# Altium footprint library con-samtec.PCBLIB: 805 footprints (part 42 of 55) (continued)
## TSW-133-02-S-D [mm]
pads (66):
  oct 1.5x1.5 hole 1: 1(40.64,-1.27) 2(40.64,1.27) 3(38.1,-1.27) 4(38.1,1.27) 5(35.56,-1.27) 6(35.56,1.27) 7(33.02,-1.27) 8(33.02,1.27) 9(30.48,-1.27) 10(30.48,1.27) 11(27.94,-1.27) 12(27.94,1.27) 13(25.4,-1.27) 14(25.4,1.27) 15(22.86,-1.27) 16(22.86,1.27) 17(20.32,-1.27) 18(20.32,1.27) 19(17.78,-1.27) 20(17.78,1.27) 21(15.24,-1.27) 22(15.24,1.27) 23(12.7,-1.27) 24(12.7,1.27) 25(10.16,-1.27) 26(10.16,1.27) 27(7.62,-1.27) 28(7.62,1.27) 29(5.08,-1.27) 30(5.08,1.27) 31(2.54,-1.27) 32(2.54,1.27) 33(0,-1.27) 34(0,1.27) 35(-2.54,-1.27) 36(-2.54,1.27) 37(-5.08,-1.27) 38(-5.08,1.27) 39(-7.62,-1.27) 40(-7.62,1.27) 41(-10.16,-1.27) 42(-10.16,1.27) 43(-12.7,-1.27) 44(-12.7,1.27) 45(-15.24,-1.27) 46(-15.24,1.27) 47(-17.78,-1.27) 48(-17.78,1.27) 49(-20.32,-1.27) 50(-20.32,1.27) 51(-22.86,-1.27) 52(-22.86,1.27) 53(-25.4,-1.27) 54(-25.4,1.27) 55(-27.94,-1.27) 56(-27.94,1.27) 57(-30.48,-1.27) 58(-30.48,1.27) 59(-33.02,-1.27) 60(-33.02,1.27) 61(-35.56,-1.27) 62(-35.56,1.27) 63(-38.1,-1.27) 64(-38.1,1.27) 65(-40.64,-1.27) 66(-40.64,1.27)
Top Overlay:
  lines w0.203: -42.039,-2.425 42.039,-2.425 42.039,2.425 -42.039,2.425 -42.039,-2.425
  text "1" at 40.432,-3.818 h0.94
  text "2" at 40.257,2.744 h0.94
Mechanical 16:
  rectangle: -40.99,-1.62 -40.29,-0.92
  rectangle: -40.99,0.92 -40.29,1.62
  rectangle: -38.45,-1.62 -37.75,-0.92
  rectangle: -38.45,0.92 -37.75,1.62
  rectangle: -35.91,-1.62 -35.21,-0.92
  rectangle: -35.91,0.92 -35.21,1.62
  rectangle: -33.37,-1.62 -32.67,-0.92
  rectangle: -33.37,0.92 -32.67,1.62
  rectangle: -30.83,-1.62 -30.13,-0.92
  rectangle: -30.83,0.92 -30.13,1.62
  rectangle: -28.29,-1.62 -27.59,-0.92
  rectangle: -28.29,0.92 -27.59,1.62
  rectangle: -25.75,-1.62 -25.05,-0.92
  rectangle: -25.75,0.92 -25.05,1.62
  rectangle: -23.21,-1.62 -22.51,-0.92
  rectangle: -23.21,0.92 -22.51,1.62
  rectangle: -20.67,-1.62 -19.97,-0.92
  rectangle: -20.67,0.92 -19.97,1.62
  rectangle: -18.13,-1.62 -17.43,-0.92
  rectangle: -18.13,0.92 -17.43,1.62
  rectangle: -15.59,-1.62 -14.89,-0.92
  rectangle: -15.59,0.92 -14.89,1.62
  rectangle: -13.05,-1.62 -12.35,-0.92
  rectangle: -13.05,0.92 -12.35,1.62
  rectangle: -10.51,-1.62 -9.81,-0.92
  rectangle: -10.51,0.92 -9.81,1.62
  rectangle: -7.97,-1.62 -7.27,-0.92
  rectangle: -7.97,0.92 -7.27,1.62
  rectangle: -5.43,-1.62 -4.73,-0.92
  rectangle: -5.43,0.92 -4.73,1.62
  rectangle: -2.89,-1.62 -2.19,-0.92
  rectangle: -2.89,0.92 -2.19,1.62
  rectangle: -0.35,-1.62 0.35,-0.92
  rectangle: -0.35,0.92 0.35,1.62
  rectangle: 2.19,-1.62 2.89,-0.92
  rectangle: 2.19,0.92 2.89,1.62
  rectangle: 4.73,-1.62 5.43,-0.92
  rectangle: 4.73,0.92 5.43,1.62
  rectangle: 7.27,-1.62 7.97,-0.92
  rectangle: 7.27,0.92 7.97,1.62
  rectangle: 9.81,-1.62 10.51,-0.92
  rectangle: 9.81,0.92 10.51,1.62
  rectangle: 12.35,-1.62 13.05,-0.92
  rectangle: 12.35,0.92 13.05,1.62
  rectangle: 14.89,-1.62 15.59,-0.92
  rectangle: 14.89,0.92 15.59,1.62
  rectangle: 17.43,-1.62 18.13,-0.92
  rectangle: 17.43,0.92 18.13,1.62
  rectangle: 19.97,-1.62 20.67,-0.92
  rectangle: 19.97,0.92 20.67,1.62
  rectangle: 22.51,-1.62 23.21,-0.92
  rectangle: 22.51,0.92 23.21,1.62
  rectangle: 25.05,-1.62 25.75,-0.92
  rectangle: 25.05,0.92 25.75,1.62
  rectangle: 27.59,-1.62 28.29,-0.92
  rectangle: 27.59,0.92 28.29,1.62
  rectangle: 30.13,-1.62 30.83,-0.92
  rectangle: 30.13,0.92 30.83,1.62
  rectangle: 32.67,-1.62 33.37,-0.92
  rectangle: 32.67,0.92 33.37,1.62
  rectangle: 35.21,-1.62 35.91,-0.92
  rectangle: 35.21,0.92 35.91,1.62
  rectangle: 37.75,-1.62 38.45,-0.92
  rectangle: 37.75,0.92 38.45,1.62
  rectangle: 40.29,-1.62 40.99,-0.92
  rectangle: 40.29,0.92 40.99,1.62

## TSW-133-02-S-D-RA [mil]
pads (66):
  oct 59.06x59.06 hole 39.37: 1(1600,60) 2(1600,160) 3(1500,60) 4(1500,160) 5(1400,60) 6(1400,160) 7(1300,60) 8(1300,160) 9(1200,60) 10(1200,160) 11(1100,60) 12(1100,160) 13(1000,60) 14(1000,160) 15(900,60) 16(900,160) 17(800,60) 18(800,160) 19(700,60) 20(700,160) 21(600,60) 22(600,160) 23(500,60) 24(500,160) 25(400,60) 26(400,160) 27(300,60) 28(300,160) 29(200,60) 30(200,160) 31(100,60) 32(100,160) 33(0,60) 34(0,160) 35(-100,60) 36(-100,160) 37(-200,60) 38(-200,160) 39(-300,60) 40(-300,160) 41(-400,60) 42(-400,160) 43(-500,60) 44(-500,160) 45(-600,60) 46(-600,160) 47(-700,60) 48(-700,160) 49(-800,60) 50(-800,160) 51(-900,60) 52(-900,160) 53(-1000,60) 54(-1000,160) 55(-1100,60) 56(-1100,160) 57(-1200,60) 58(-1200,160) 59(-1300,60) 60(-1300,160) 61(-1400,60) 62(-1400,160) 63(-1500,60) 64(-1500,160) 65(-1600,60) 66(-1600,160)
Top Overlay:
  rectangle: -1610,-310.63 -1590,-80.32
  rectangle: -1510,-310.63 -1490,-80.32
  rectangle: -1410,-310.63 -1390,-80.32
  rectangle: -1310,-310.63 -1290,-80.32
  rectangle: -1210,-310.63 -1190,-80.32
  rectangle: -1110,-310.63 -1090,-80.32
  rectangle: -1010,-310.63 -990,-80.32
  rectangle: -910,-310.63 -890,-80.32
  rectangle: -810,-310.63 -790,-80.32
  rectangle: -710,-310.63 -690,-80.32
  rectangle: -610,-310.63 -590,-80.32
  rectangle: -510,-310.63 -490,-80.32
  rectangle: -410,-310.63 -390,-80.32
  rectangle: -310,-310.63 -290,-80.32
  rectangle: -210,-310.63 -190,-80.32
  rectangle: -110,-310.63 -90,-80.32
  rectangle: -10,-310.63 10,-80.32
  rectangle: 90,-310.63 110,-80.32
  rectangle: 190,-310.63 210,-80.32
  rectangle: 290,-310.63 310,-80.32
  rectangle: 390,-310.63 410,-80.32
  rectangle: 490,-310.63 510,-80.32
  rectangle: 590,-310.63 610,-80.32
  rectangle: 690,-310.63 710,-80.32
  rectangle: 790,-310.63 810,-80.32
  rectangle: 890,-310.63 910,-80.32
  rectangle: 990,-310.63 1010,-80.32
  rectangle: 1090,-310.63 1110,-80.32
  rectangle: 1190,-310.63 1210,-80.32
  rectangle: 1290,-310.63 1310,-80.32
  rectangle: 1390,-310.63 1410,-80.32
  rectangle: 1490,-310.63 1510,-80.32
  rectangle: 1590,-310.63 1610,-80.32
  lines w8: -1655.08,-80.55 1655.08,-80.55 1655.08,-4.17 -1655.08,-4.17 -1655.08,-80.55
  text "1" at 1650.59,30.51 h36.81
  text "2" at 1649.21,129.53 h36.81
Mechanical 16:
  rectangle: -1610,0 -1590,170
  rectangle: -1510,0 -1490,170
  rectangle: -1410,0 -1390,170
  rectangle: -1310,0 -1290,170
  rectangle: -1210,0 -1190,170
  rectangle: -1110,0 -1090,170
  rectangle: -1010,0 -990,170
  rectangle: -910,0 -890,170
  rectangle: -810,0 -790,170
  rectangle: -710,0 -690,170
  rectangle: -610,0 -590,170
  rectangle: -510,0 -490,170
  rectangle: -410,0 -390,170
  rectangle: -310,0 -290,170
  rectangle: -210,0 -190,170
  rectangle: -110,0 -90,170
  rectangle: -10,0 10,170
  rectangle: 90,0 110,170
  rectangle: 190,0 210,170
  rectangle: 290,0 310,170
  rectangle: 390,0 410,170
  rectangle: 490,0 510,170
  rectangle: 590,0 610,170
  rectangle: 690,0 710,170
  rectangle: 790,0 810,170
  rectangle: 890,0 910,170
  rectangle: 990,0 1010,170
  rectangle: 1090,0 1110,170
  rectangle: 1190,0 1210,170
  rectangle: 1290,0 1310,170
  rectangle: 1390,0 1410,170
  rectangle: 1490,0 1510,170
  rectangle: 1590,0 1610,170

## TSW-133-02-S-Q [mm]
pads (66):
  oct 1.5x1.5 hole 1: 1(40.64,-2.54) 2(40.64,2.54) 3(38.1,-2.54) 4(38.1,2.54) 5(35.56,-2.54) 6(35.56,2.54) 7(33.02,-2.54) 8(33.02,2.54) 9(30.48,-2.54) 10(30.48,2.54) 11(27.94,-2.54) 12(27.94,2.54) 13(25.4,-2.54) 14(25.4,2.54) 15(22.86,-2.54) 16(22.86,2.54) 17(20.32,-2.54) 18(20.32,2.54) 19(17.78,-2.54) 20(17.78,2.54) 21(15.24,-2.54) 22(15.24,2.54) 23(12.7,-2.54) 24(12.7,2.54) 25(10.16,-2.54) 26(10.16,2.54) 27(7.62,-2.54) 28(7.62,2.54) 29(5.08,-2.54) 30(5.08,2.54) 31(2.54,-2.54) 32(2.54,2.54) 33(0,-2.54) 34(0,2.54) 35(-2.54,-2.54) 36(-2.54,2.54) 37(-5.08,-2.54) 38(-5.08,2.54) 39(-7.62,-2.54) 40(-7.62,2.54) 41(-10.16,-2.54) 42(-10.16,2.54) 43(-12.7,-2.54) 44(-12.7,2.54) 45(-15.24,-2.54) 46(-15.24,2.54) 47(-17.78,-2.54) 48(-17.78,2.54) 49(-20.32,-2.54) 50(-20.32,2.54) 51(-22.86,-2.54) 52(-22.86,2.54) 53(-25.4,-2.54) 54(-25.4,2.54) 55(-27.94,-2.54) 56(-27.94,2.54) 57(-30.48,-2.54) 58(-30.48,2.54) 59(-33.02,-2.54) 60(-33.02,2.54) 61(-35.56,-2.54) 62(-35.56,2.54) 63(-38.1,-2.54) 64(-38.1,2.54) 65(-40.64,-2.54) 66(-40.64,2.54)
Top Overlay:
  lines w0.203: -42.039,-3.695 42.039,-3.695 42.039,3.695 -42.039,3.695 -42.039,-3.695
  text "1" at 40.482,-5.138 h0.94
  text "2" at 40.382,3.989 h0.94
Mechanical 16:
  rectangle: -40.99,-2.89 -40.29,-2.19
  rectangle: -40.99,2.19 -40.29,2.89
  rectangle: -38.45,-2.89 -37.75,-2.19
  rectangle: -38.45,2.19 -37.75,2.89
  rectangle: -35.91,-2.89 -35.21,-2.19
  rectangle: -35.91,2.19 -35.21,2.89
  rectangle: -33.37,-2.89 -32.67,-2.19
  rectangle: -33.37,2.19 -32.67,2.89
  rectangle: -30.83,-2.89 -30.13,-2.19
  rectangle: -30.83,2.19 -30.13,2.89
  rectangle: -28.29,-2.89 -27.59,-2.19
  rectangle: -28.29,2.19 -27.59,2.89
  rectangle: -25.75,-2.89 -25.05,-2.19
  rectangle: -25.75,2.19 -25.05,2.89
  rectangle: -23.21,-2.89 -22.51,-2.19
  rectangle: -23.21,2.19 -22.51,2.89
  rectangle: -20.67,-2.89 -19.97,-2.19
  rectangle: -20.67,2.19 -19.97,2.89
  rectangle: -18.13,-2.89 -17.43,-2.19
  rectangle: -18.13,2.19 -17.43,2.89
  rectangle: -15.59,-2.89 -14.89,-2.19
  rectangle: -15.59,2.19 -14.89,2.89
  rectangle: -13.05,-2.89 -12.35,-2.19
  rectangle: -13.05,2.19 -12.35,2.89
  rectangle: -10.51,-2.89 -9.81,-2.19
  rectangle: -10.51,2.19 -9.81,2.89
  rectangle: -7.97,-2.89 -7.27,-2.19
  rectangle: -7.97,2.19 -7.27,2.89
  rectangle: -5.43,-2.89 -4.73,-2.19
  rectangle: -5.43,2.19 -4.73,2.89
  rectangle: -2.89,-2.89 -2.19,-2.19
  rectangle: -2.89,2.19 -2.19,2.89
  rectangle: -0.35,-2.89 0.35,-2.19
  rectangle: -0.35,2.19 0.35,2.89
  rectangle: 2.19,-2.89 2.89,-2.19
  rectangle: 2.19,2.19 2.89,2.89
  rectangle: 4.73,-2.89 5.43,-2.19
  rectangle: 4.73,2.19 5.43,2.89
  rectangle: 7.27,-2.89 7.97,-2.19
  rectangle: 7.27,2.19 7.97,2.89
  rectangle: 9.81,-2.89 10.51,-2.19
  rectangle: 9.81,2.19 10.51,2.89
  rectangle: 12.35,-2.89 13.05,-2.19
  rectangle: 12.35,2.19 13.05,2.89
  rectangle: 14.89,-2.89 15.59,-2.19
  rectangle: 14.89,2.19 15.59,2.89
  rectangle: 17.43,-2.89 18.13,-2.19
  rectangle: 17.43,2.19 18.13,2.89
  rectangle: 19.97,-2.89 20.67,-2.19
  rectangle: 19.97,2.19 20.67,2.89
  rectangle: 22.51,-2.89 23.21,-2.19
  rectangle: 22.51,2.19 23.21,2.89
  rectangle: 25.05,-2.89 25.75,-2.19
  rectangle: 25.05,2.19 25.75,2.89
  rectangle: 27.59,-2.89 28.29,-2.19
  rectangle: 27.59,2.19 28.29,2.89
  rectangle: 30.13,-2.89 30.83,-2.19
  rectangle: 30.13,2.19 30.83,2.89
  rectangle: 32.67,-2.89 33.37,-2.19
  rectangle: 32.67,2.19 33.37,2.89
  rectangle: 35.21,-2.89 35.91,-2.19
  rectangle: 35.21,2.19 35.91,2.89
  rectangle: 37.75,-2.89 38.45,-2.19
  rectangle: 37.75,2.19 38.45,2.89
  rectangle: 40.29,-2.89 40.99,-2.19
  rectangle: 40.29,2.19 40.99,2.89

## TSW-133-02-S-Q-RA [mil]
pads (66):
  oct 59.06x59.06 hole 39.37: 1(1600,60) 2(1600,260) 3(1500,60) 4(1500,260) 5(1400,60) 6(1400,260) 7(1300,60) 8(1300,260) 9(1200,60) 10(1200,260) 11(1100,60) 12(1100,260) 13(1000,60) 14(1000,260) 15(900,60) 16(900,260) 17(800,60) 18(800,260) 19(700,60) 20(700,260) 21(600,60) 22(600,260) 23(500,60) 24(500,260) 25(400,60) 26(400,260) 27(300,60) 28(300,260) 29(200,60) 30(200,260) 31(100,60) 32(100,260) 33(0,60) 34(0,260) 35(-100,60) 36(-100,260) 37(-200,60) 38(-200,260) 39(-300,60) 40(-300,260) 41(-400,60) 42(-400,260) 43(-500,60) 44(-500,260) 45(-600,60) 46(-600,260) 47(-700,60) 48(-700,260) 49(-800,60) 50(-800,260) 51(-900,60) 52(-900,260) 53(-1000,60) 54(-1000,260) 55(-1100,60) 56(-1100,260) 57(-1200,60) 58(-1200,260) 59(-1300,60) 60(-1300,260) 61(-1400,60) 62(-1400,260) 63(-1500,60) 64(-1500,260) 65(-1600,60) 66(-1600,260)
Top Overlay:
  rectangle: -1610,-310.63 -1590,-80.32
  rectangle: -1510,-310.63 -1490,-80.32
  rectangle: -1410,-310.63 -1390,-80.32
  rectangle: -1310,-310.63 -1290,-80.32
  rectangle: -1210,-310.63 -1190,-80.32
  rectangle: -1110,-310.63 -1090,-80.32
  rectangle: -1010,-310.63 -990,-80.32
  rectangle: -910,-310.63 -890,-80.32
  rectangle: -810,-310.63 -790,-80.32
  rectangle: -710,-310.63 -690,-80.32
  rectangle: -610,-310.63 -590,-80.32
  rectangle: -510,-310.63 -490,-80.32
  rectangle: -410,-310.63 -390,-80.32
  rectangle: -310,-310.63 -290,-80.32
  rectangle: -210,-310.63 -190,-80.32
  rectangle: -110,-310.63 -90,-80.32
  rectangle: -10,-310.63 10,-80.32
  rectangle: 90,-310.63 110,-80.32
  rectangle: 190,-310.63 210,-80.32
  rectangle: 290,-310.63 310,-80.32
  rectangle: 390,-310.63 410,-80.32
  rectangle: 490,-310.63 510,-80.32
  rectangle: 590,-310.63 610,-80.32
  rectangle: 690,-310.63 710,-80.32
  rectangle: 790,-310.63 810,-80.32
  rectangle: 890,-310.63 910,-80.32
  rectangle: 990,-310.63 1010,-80.32
  rectangle: 1090,-310.63 1110,-80.32
  rectangle: 1190,-310.63 1210,-80.32
  rectangle: 1290,-310.63 1310,-80.32
  rectangle: 1390,-310.63 1410,-80.32
  rectangle: 1490,-310.63 1510,-80.32
  rectangle: 1590,-310.63 1610,-80.32
  lines w8: -1655.08,-80.55 1655.08,-80.55 1655.08,-4.17 -1655.08,-4.17 -1655.08,-80.55
  text "1" at 1653.54,43.31 h36.81
  text "2" at 1651.18,242.72 h36.81
Mechanical 16:
  rectangle: -1610,0 -1590,270
  rectangle: -1510,0 -1490,270
  rectangle: -1410,0 -1390,270
  rectangle: -1310,0 -1290,270
  rectangle: -1210,0 -1190,270
  rectangle: -1110,0 -1090,270
  rectangle: -1010,0 -990,270
  rectangle: -910,0 -890,270
  rectangle: -810,0 -790,270
  rectangle: -710,0 -690,270
  rectangle: -610,0 -590,270
  rectangle: -510,0 -490,270
  rectangle: -410,0 -390,270
  rectangle: -310,0 -290,270
  rectangle: -210,0 -190,270
  rectangle: -110,0 -90,270
  rectangle: -10,0 10,270
  rectangle: 90,0 110,270
  rectangle: 190,0 210,270
  rectangle: 290,0 310,270
  rectangle: 390,0 410,270
  rectangle: 490,0 510,270
  rectangle: 590,0 610,270
  rectangle: 690,0 710,270
  rectangle: 790,0 810,270
  rectangle: 890,0 910,270
  rectangle: 990,0 1010,270
  rectangle: 1090,0 1110,270
  rectangle: 1190,0 1210,270
  rectangle: 1290,0 1310,270
  rectangle: 1390,0 1410,270
  rectangle: 1490,0 1510,270
  rectangle: 1590,0 1610,270

## TSW-133-02-S-S [mm]
pads (33):
  oct 1.5x1.5 hole 1: 1(40.64,0) 2(38.1,0) 3(35.56,0) 4(33.02,0) 5(30.48,0) 6(27.94,0) 7(25.4,0) 8(22.86,0) 9(20.32,0) 10(17.78,0) 11(15.24,0) 12(12.7,0) 13(10.16,0) 14(7.62,0) 15(5.08,0) 16(2.54,0) 17(0,0) 18(-2.54,0) 19(-5.08,0) 20(-7.62,0) 21(-10.16,0) 22(-12.7,0) 23(-15.24,0) 24(-17.78,0) 25(-20.32,0) 26(-22.86,0) 27(-25.4,0) 28(-27.94,0) 29(-30.48,0) 30(-33.02,0) 31(-35.56,0) 32(-38.1,0) 33(-40.64,0)
Top Overlay:
  lines w0.203: -42.039,-1.155 42.039,-1.155 42.039,1.155 -42.039,1.155 -42.039,-1.155
  text "1" at 40.382,-2.498 h0.94
Mechanical 16:
  rectangle: -40.99,-0.35 -40.29,0.35
  rectangle: -38.45,-0.35 -37.75,0.35
  rectangle: -35.91,-0.35 -35.21,0.35
  rectangle: -33.37,-0.35 -32.67,0.35
  rectangle: -30.83,-0.35 -30.13,0.35
  rectangle: -28.29,-0.35 -27.59,0.35
  rectangle: -25.75,-0.35 -25.05,0.35
  rectangle: -23.21,-0.35 -22.51,0.35
  rectangle: -20.67,-0.35 -19.97,0.35
  rectangle: -18.13,-0.35 -17.43,0.35
  rectangle: -15.59,-0.35 -14.89,0.35
  rectangle: -13.05,-0.35 -12.35,0.35
  rectangle: -10.51,-0.35 -9.81,0.35
  rectangle: -7.97,-0.35 -7.27,0.35
  rectangle: -5.43,-0.35 -4.73,0.35
  rectangle: -2.89,-0.35 -2.19,0.35
  rectangle: -0.35,-0.35 0.35,0.35
  rectangle: 2.19,-0.35 2.89,0.35
  rectangle: 4.73,-0.35 5.43,0.35
  rectangle: 7.27,-0.35 7.97,0.35
  rectangle: 9.81,-0.35 10.51,0.35
  rectangle: 12.35,-0.35 13.05,0.35
  rectangle: 14.89,-0.35 15.59,0.35
  rectangle: 17.43,-0.35 18.13,0.35
  rectangle: 19.97,-0.35 20.67,0.35
  rectangle: 22.51,-0.35 23.21,0.35
  rectangle: 25.05,-0.35 25.75,0.35
  rectangle: 27.59,-0.35 28.29,0.35
  rectangle: 30.13,-0.35 30.83,0.35
  rectangle: 32.67,-0.35 33.37,0.35
  rectangle: 35.21,-0.35 35.91,0.35
  rectangle: 37.75,-0.35 38.45,0.35
  rectangle: 40.29,-0.35 40.99,0.35

## TSW-133-02-S-S-RA [mil]
pads (33):
  oct 59.06x59.06 hole 39.37: 1(1600,60) 2(1500,60) 3(1400,60) 4(1300,60) 5(1200,60) 6(1100,60) 7(1000,60) 8(900,60) 9(800,60) 10(700,60) 11(600,60) 12(500,60) 13(400,60) 14(300,60) 15(200,60) 16(100,60) 17(0,60) 18(-100,60) 19(-200,60) 20(-300,60) 21(-400,60) 22(-500,60) 23(-600,60) 24(-700,60) 25(-800,60) 26(-900,60) 27(-1000,60) 28(-1100,60) 29(-1200,60) 30(-1300,60) 31(-1400,60) 32(-1500,60) 33(-1600,60)
Top Overlay:
  rectangle: -1610,-310.63 -1590,-80.32
  rectangle: -1510,-310.63 -1490,-80.32
  rectangle: -1410,-310.63 -1390,-80.32
  rectangle: -1310,-310.63 -1290,-80.32
  rectangle: -1210,-310.63 -1190,-80.32
  rectangle: -1110,-310.63 -1090,-80.32
  rectangle: -1010,-310.63 -990,-80.32
  rectangle: -910,-310.63 -890,-80.32
  rectangle: -810,-310.63 -790,-80.32
  rectangle: -710,-310.63 -690,-80.32
  rectangle: -610,-310.63 -590,-80.32
  rectangle: -510,-310.63 -490,-80.32
  rectangle: -410,-310.63 -390,-80.32
  rectangle: -310,-310.63 -290,-80.32
  rectangle: -210,-310.63 -190,-80.32
  rectangle: -110,-310.63 -90,-80.32
  rectangle: -10,-310.63 10,-80.32
  rectangle: 90,-310.63 110,-80.32
  rectangle: 190,-310.63 210,-80.32
  rectangle: 290,-310.63 310,-80.32
  rectangle: 390,-310.63 410,-80.32
  rectangle: 490,-310.63 510,-80.32
  rectangle: 590,-310.63 610,-80.32
  rectangle: 690,-310.63 710,-80.32
  rectangle: 790,-310.63 810,-80.32
  rectangle: 890,-310.63 910,-80.32
  rectangle: 990,-310.63 1010,-80.32
  rectangle: 1090,-310.63 1110,-80.32
  rectangle: 1190,-310.63 1210,-80.32
  rectangle: 1290,-310.63 1310,-80.32
  rectangle: 1390,-310.63 1410,-80.32
  rectangle: 1490,-310.63 1510,-80.32
  rectangle: 1590,-310.63 1610,-80.32
  lines w8: -1655.08,-80.55 1655.08,-80.55 1655.08,-4.17 -1655.08,-4.17 -1655.08,-80.55
  text "1" at 1650.47,45.35 h36.81
Mechanical 16:
  rectangle: -1610,0 -1590,70
  rectangle: -1510,0 -1490,70
  rectangle: -1410,0 -1390,70
  rectangle: -1310,0 -1290,70
  rectangle: -1210,0 -1190,70
  rectangle: -1110,0 -1090,70
  rectangle: -1010,0 -990,70
  rectangle: -910,0 -890,70
  rectangle: -810,0 -790,70
  rectangle: -710,0 -690,70
  rectangle: -610,0 -590,70
  rectangle: -510,0 -490,70
  rectangle: -410,0 -390,70
  rectangle: -310,0 -290,70
  rectangle: -210,0 -190,70
  rectangle: -110,0 -90,70
  rectangle: -10,0 10,70
  rectangle: 90,0 110,70
  rectangle: 190,0 210,70
  rectangle: 290,0 310,70
  rectangle: 390,0 410,70
  rectangle: 490,0 510,70
  rectangle: 590,0 610,70
  rectangle: 690,0 710,70
  rectangle: 790,0 810,70
  rectangle: 890,0 910,70
  rectangle: 990,0 1010,70
  rectangle: 1090,0 1110,70
  rectangle: 1190,0 1210,70
  rectangle: 1290,0 1310,70
  rectangle: 1390,0 1410,70
  rectangle: 1490,0 1510,70
  rectangle: 1590,0 1610,70

## TSW-133-02-S-T [mm]
pads (99):
  oct 1.5x1.5 hole 1: 1(40.64,-2.54) 2(40.64,0) 3(40.64,2.54) 4(38.1,-2.54) 5(38.1,0) 6(38.1,2.54) 7(35.56,-2.54) 8(35.56,0) 9(35.56,2.54) 10(33.02,-2.54) 11(33.02,0) 12(33.02,2.54) 13(30.48,-2.54) 14(30.48,0) 15(30.48,2.54) 16(27.94,-2.54) 17(27.94,0) 18(27.94,2.54) 19(25.4,-2.54) 20(25.4,0) 21(25.4,2.54) 22(22.86,-2.54) 23(22.86,0) 24(22.86,2.54) 25(20.32,-2.54) 26(20.32,0) 27(20.32,2.54) 28(17.78,-2.54) 29(17.78,0) 30(17.78,2.54) 31(15.24,-2.54) 32(15.24,0) 33(15.24,2.54) 34(12.7,-2.54) 35(12.7,0) 36(12.7,2.54) 37(10.16,-2.54) 38(10.16,0) 39(10.16,2.54) 40(7.62,-2.54) 41(7.62,0) 42(7.62,2.54) 43(5.08,-2.54) 44(5.08,0) 45(5.08,2.54) 46(2.54,-2.54) 47(2.54,0) 48(2.54,2.54) 49(0,-2.54) 50(0,0) 51(0,2.54) 52(-2.54,-2.54) 53(-2.54,0) 54(-2.54,2.54) 55(-5.08,-2.54) 56(-5.08,0) 57(-5.08,2.54) 58(-7.62,-2.54) 59(-7.62,0) 60(-7.62,2.54) 61(-10.16,-2.54) 62(-10.16,0) 63(-10.16,2.54) 64(-12.7,-2.54) 65(-12.7,0) 66(-12.7,2.54) 67(-15.24,-2.54) 68(-15.24,0) 69(-15.24,2.54) 70(-17.78,-2.54) 71(-17.78,0) 72(-17.78,2.54) 73(-20.32,-2.54) 74(-20.32,0) 75(-20.32,2.54) 76(-22.86,-2.54) 77(-22.86,0) 78(-22.86,2.54) 79(-25.4,-2.54) 80(-25.4,0) 81(-25.4,2.54) 82(-27.94,-2.54) 83(-27.94,0) 84(-27.94,2.54) 85(-30.48,-2.54) 86(-30.48,0) 87(-30.48,2.54) 88(-33.02,-2.54) 89(-33.02,0) 90(-33.02,2.54) 91(-35.56,-2.54) 92(-35.56,0) 93(-35.56,2.54) 94(-38.1,-2.54) 95(-38.1,0) 96(-38.1,2.54) 97(-40.64,-2.54) 98(-40.64,0) 99(-40.64,2.54)
Top Overlay:
  lines w0.203: -42.039,-3.695 42.039,-3.695 42.039,3.695 -42.039,3.695 -42.039,-3.695
  text "1" at 40.332,-5.188 h0.94
  text "3" at 40.328,3.989 h0.94
Mechanical 16:
  rectangle: -40.99,-2.89 -40.29,-2.19
  rectangle: -40.99,-0.35 -40.29,0.35
  rectangle: -40.99,2.19 -40.29,2.89
  rectangle: -38.45,-2.89 -37.75,-2.19
  rectangle: -38.45,-0.35 -37.75,0.35
  rectangle: -38.45,2.19 -37.75,2.89
  rectangle: -35.91,-2.89 -35.21,-2.19
  rectangle: -35.91,-0.35 -35.21,0.35
  rectangle: -35.91,2.19 -35.21,2.89
  rectangle: -33.37,-2.89 -32.67,-2.19
  rectangle: -33.37,-0.35 -32.67,0.35
  rectangle: -33.37,2.19 -32.67,2.89
  rectangle: -30.83,-2.89 -30.13,-2.19
  rectangle: -30.83,-0.35 -30.13,0.35
  rectangle: -30.83,2.19 -30.13,2.89
  rectangle: -28.29,-2.89 -27.59,-2.19
  rectangle: -28.29,-0.35 -27.59,0.35
  rectangle: -28.29,2.19 -27.59,2.89
  rectangle: -25.75,-2.89 -25.05,-2.19
  rectangle: -25.75,-0.35 -25.05,0.35
  rectangle: -25.75,2.19 -25.05,2.89
  rectangle: -23.21,-2.89 -22.51,-2.19
  rectangle: -23.21,-0.35 -22.51,0.35
  rectangle: -23.21,2.19 -22.51,2.89
  rectangle: -20.67,-2.89 -19.97,-2.19
  rectangle: -20.67,-0.35 -19.97,0.35
  rectangle: -20.67,2.19 -19.97,2.89
  rectangle: -18.13,-2.89 -17.43,-2.19
  rectangle: -18.13,-0.35 -17.43,0.35
  rectangle: -18.13,2.19 -17.43,2.89
  rectangle: -15.59,-2.89 -14.89,-2.19
  rectangle: -15.59,-0.35 -14.89,0.35
  rectangle: -15.59,2.19 -14.89,2.89
  rectangle: -13.05,-2.89 -12.35,-2.19
  rectangle: -13.05,-0.35 -12.35,0.35
  rectangle: -13.05,2.19 -12.35,2.89
  rectangle: -10.51,-2.89 -9.81,-2.19
  rectangle: -10.51,-0.35 -9.81,0.35
  rectangle: -10.51,2.19 -9.81,2.89
  rectangle: -7.97,-2.89 -7.27,-2.19
  rectangle: -7.97,-0.35 -7.27,0.35
  rectangle: -7.97,2.19 -7.27,2.89
  rectangle: -5.43,-2.89 -4.73,-2.19
  rectangle: -5.43,-0.35 -4.73,0.35
  rectangle: -5.43,2.19 -4.73,2.89
  rectangle: -2.89,-2.89 -2.19,-2.19
  rectangle: -2.89,-0.35 -2.19,0.35
  rectangle: -2.89,2.19 -2.19,2.89
  rectangle: -0.35,-2.89 0.35,-2.19
  rectangle: -0.35,-0.35 0.35,0.35
  rectangle: -0.35,2.19 0.35,2.89
  rectangle: 2.19,-2.89 2.89,-2.19
  rectangle: 2.19,-0.35 2.89,0.35
  rectangle: 2.19,2.19 2.89,2.89
  rectangle: 4.73,-2.89 5.43,-2.19
  rectangle: 4.73,-0.35 5.43,0.35
  rectangle: 4.73,2.19 5.43,2.89
  rectangle: 7.27,-2.89 7.97,-2.19
  rectangle: 7.27,-0.35 7.97,0.35
  rectangle: 7.27,2.19 7.97,2.89
  rectangle: 9.81,-2.89 10.51,-2.19
  rectangle: 9.81,-0.35 10.51,0.35
  rectangle: 9.81,2.19 10.51,2.89
  rectangle: 12.35,-2.89 13.05,-2.19
  rectangle: 12.35,-0.35 13.05,0.35
  rectangle: 12.35,2.19 13.05,2.89
  rectangle: 14.89,-2.89 15.59,-2.19
  rectangle: 14.89,-0.35 15.59,0.35
  rectangle: 14.89,2.19 15.59,2.89
  rectangle: 17.43,-2.89 18.13,-2.19
  rectangle: 17.43,-0.35 18.13,0.35
  rectangle: 17.43,2.19 18.13,2.89
  rectangle: 19.97,-2.89 20.67,-2.19
  rectangle: 19.97,-0.35 20.67,0.35
  rectangle: 19.97,2.19 20.67,2.89
  rectangle: 22.51,-2.89 23.21,-2.19
  rectangle: 22.51,-0.35 23.21,0.35
  rectangle: 22.51,2.19 23.21,2.89
  rectangle: 25.05,-2.89 25.75,-2.19
  rectangle: 25.05,-0.35 25.75,0.35
  rectangle: 25.05,2.19 25.75,2.89
  rectangle: 27.59,-2.89 28.29,-2.19
  rectangle: 27.59,-0.35 28.29,0.35
  rectangle: 27.59,2.19 28.29,2.89
  rectangle: 30.13,-2.89 30.83,-2.19
  rectangle: 30.13,-0.35 30.83,0.35
  rectangle: 30.13,2.19 30.83,2.89
  rectangle: 32.67,-2.89 33.37,-2.19
  rectangle: 32.67,-0.35 33.37,0.35
  rectangle: 32.67,2.19 33.37,2.89
  rectangle: 35.21,-2.89 35.91,-2.19
  rectangle: 35.21,-0.35 35.91,0.35
  rectangle: 35.21,2.19 35.91,2.89
  rectangle: 37.75,-2.89 38.45,-2.19
  rectangle: 37.75,-0.35 38.45,0.35
  rectangle: 37.75,2.19 38.45,2.89
  rectangle: 40.29,-2.89 40.99,-2.19
  rectangle: 40.29,-0.35 40.99,0.35
  rectangle: 40.29,2.19 40.99,2.89

## TSW-133-02-S-T-RA [mil]
pads (99):
  oct 59.06x59.06 hole 39.37: 1(1600,60) 2(1600,160) 3(1600,260) 4(1500,60) 5(1500,160) 6(1500,260) 7(1400,60) 8(1400,160) 9(1400,260) 10(1300,60) 11(1300,160) 12(1300,260) 13(1200,60) 14(1200,160) 15(1200,260) 16(1100,60) 17(1100,160) 18(1100,260) 19(1000,60) 20(1000,160) 21(1000,260) 22(900,60) 23(900,160) 24(900,260) 25(800,60) 26(800,160) 27(800,260) 28(700,60) 29(700,160) 30(700,260) 31(600,60) 32(600,160) 33(600,260) 34(500,60) 35(500,160) 36(500,260) 37(400,60) 38(400,160) 39(400,260) 40(300,60) 41(300,160) 42(300,260) 43(200,60) 44(200,160) 45(200,260) 46(100,60) 47(100,160) 48(100,260) 49(0,60) 50(0,160) 51(0,260) 52(-100,60) 53(-100,160) 54(-100,260) 55(-200,60) 56(-200,160) 57(-200,260) 58(-300,60) 59(-300,160) 60(-300,260) 61(-400,60) 62(-400,160) 63(-400,260) 64(-500,60) 65(-500,160) 66(-500,260) 67(-600,60) 68(-600,160) 69(-600,260) 70(-700,60) 71(-700,160) 72(-700,260) 73(-800,60) 74(-800,160) 75(-800,260) 76(-900,60) 77(-900,160) 78(-900,260) 79(-1000,60) 80(-1000,160) 81(-1000,260) 82(-1100,60) 83(-1100,160) 84(-1100,260) 85(-1200,60) 86(-1200,160) 87(-1200,260) 88(-1300,60) 89(-1300,160) 90(-1300,260) 91(-1400,60) 92(-1400,160) 93(-1400,260) 94(-1500,60) 95(-1500,160) 96(-1500,260) 97(-1600,60) 98(-1600,160) 99(-1600,260)
Top Overlay:
  rectangle: -1610,-310.63 -1590,-80.32
  rectangle: -1510,-310.63 -1490,-80.32
  rectangle: -1410,-310.63 -1390,-80.32
  rectangle: -1310,-310.63 -1290,-80.32
  rectangle: -1210,-310.63 -1190,-80.32
  rectangle: -1110,-310.63 -1090,-80.32
  rectangle: -1010,-310.63 -990,-80.32
  rectangle: -910,-310.63 -890,-80.32
  rectangle: -810,-310.63 -790,-80.32
  rectangle: -710,-310.63 -690,-80.32
  rectangle: -610,-310.63 -590,-80.32
  rectangle: -510,-310.63 -490,-80.32
  rectangle: -410,-310.63 -390,-80.32
  rectangle: -310,-310.63 -290,-80.32
  rectangle: -210,-310.63 -190,-80.32
  rectangle: -110,-310.63 -90,-80.32
  rectangle: -10,-310.63 10,-80.32
  rectangle: 90,-310.63 110,-80.32
  rectangle: 190,-310.63 210,-80.32
  rectangle: 290,-310.63 310,-80.32
  rectangle: 390,-310.63 410,-80.32
  rectangle: 490,-310.63 510,-80.32
  rectangle: 590,-310.63 610,-80.32
  rectangle: 690,-310.63 710,-80.32
  rectangle: 790,-310.63 810,-80.32
  rectangle: 890,-310.63 910,-80.32
  rectangle: 990,-310.63 1010,-80.32
  rectangle: 1090,-310.63 1110,-80.32
  rectangle: 1190,-310.63 1210,-80.32
  rectangle: 1290,-310.63 1310,-80.32
  rectangle: 1390,-310.63 1410,-80.32
  rectangle: 1490,-310.63 1510,-80.32
  rectangle: 1590,-310.63 1610,-80.32
  lines w8: -1655.08,-80.55 1655.08,-80.55 1655.08,-4.17 -1655.08,-4.17 -1655.08,-80.55
  text "1" at 1651.57,41.34 h36.81
  text "3" at 1652.17,236.81 h36.81
Mechanical 16:
  rectangle: -1610,0 -1590,270
  rectangle: -1510,0 -1490,270
  rectangle: -1410,0 -1390,270
  rectangle: -1310,0 -1290,270
  rectangle: -1210,0 -1190,270
  rectangle: -1110,0 -1090,270
  rectangle: -1010,0 -990,270
  rectangle: -910,0 -890,270
  rectangle: -810,0 -790,270
  rectangle: -710,0 -690,270
  rectangle: -610,0 -590,270
  rectangle: -510,0 -490,270
  rectangle: -410,0 -390,270
  rectangle: -310,0 -290,270
  rectangle: -210,0 -190,270
  rectangle: -110,0 -90,270
  rectangle: -10,0 10,270
  rectangle: 90,0 110,270
  rectangle: 190,0 210,270
  rectangle: 290,0 310,270
  rectangle: 390,0 410,270
  rectangle: 490,0 510,270
  rectangle: 590,0 610,270
  rectangle: 690,0 710,270
  rectangle: 790,0 810,270
  rectangle: 890,0 910,270
  rectangle: 990,0 1010,270
  rectangle: 1090,0 1110,270
  rectangle: 1190,0 1210,270
  rectangle: 1290,0 1310,270
  rectangle: 1390,0 1410,270
  rectangle: 1490,0 1510,270
  rectangle: 1590,0 1610,270